# Altium footprint library 电流测试工装板.PcbLib: 36 footprints (part 2 of 3)
Each footprint in its own frame and in the unit in brackets; x right, y up, seen from the top. Pads: shape width x height; smd on the part's side, far side on the other; paste and mask are expansions set on the pad; w line width, h text height; cw(c..) or ccw(c..) is an arc to the next point about the centre after c.
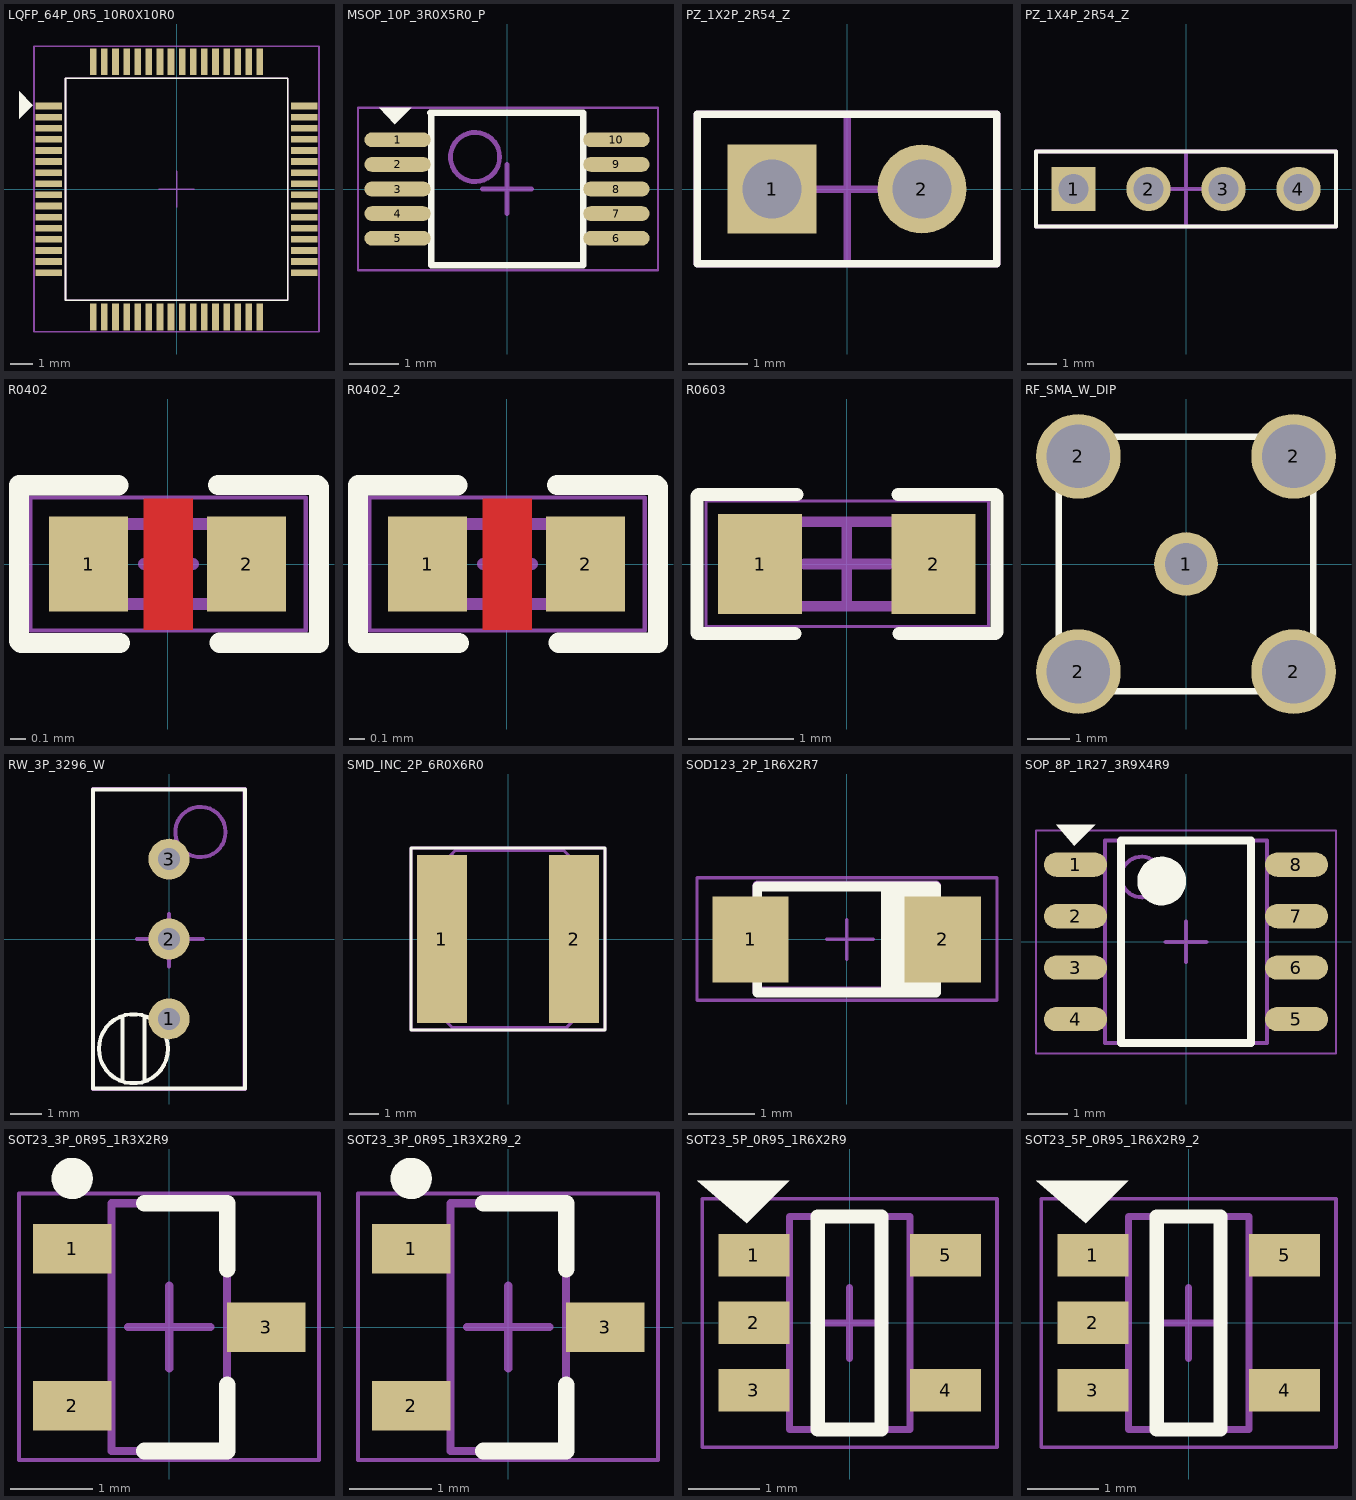
[diagram p1: the footprints below, top view; thin cyan lines are the x and y axes]

## LQFP_64P_0R5_10R0X10R0 [mm]
pads (64):
  rect 1.2x0.3 smd: 1(-5.75,3.75) 2(-5.75,3.25) 3(-5.75,2.75) 4(-5.75,2.25) 5(-5.75,1.75) 6(-5.75,1.25) 7(-5.75,0.75) 8(-5.75,0.25) 9(-5.75,-0.25) 10(-5.75,-0.75) 11(-5.75,-1.25) 12(-5.75,-1.75) 13(-5.75,-2.25) 14(-5.75,-2.75) 15(-5.75,-3.25) 16(-5.75,-3.75) 33(5.75,-3.75) 34(5.75,-3.25) 35(5.75,-2.75) 36(5.75,-2.25) 37(5.75,-1.75) 38(5.75,-1.25) 39(5.75,-0.75) 40(5.75,-0.25) 41(5.75,0.25) 42(5.75,0.75) 43(5.75,1.25) 44(5.75,1.75) 45(5.75,2.25) 46(5.75,2.75) 47(5.75,3.25) 48(5.75,3.75)
  rect 0.3x1.2 smd: 17(-3.75,-5.75) 18(-3.25,-5.75) 19(-2.75,-5.75) 20(-2.25,-5.75) 21(-1.75,-5.75) 22(-1.25,-5.75) 23(-0.75,-5.75) 24(-0.25,-5.75) 25(0.25,-5.75) 26(0.75,-5.75) 27(1.25,-5.75) 28(1.75,-5.75) 29(2.25,-5.75) 30(2.75,-5.75) 31(3.25,-5.75) 32(3.75,-5.75) 49(3.75,5.75) 50(3.25,5.75) 51(2.75,5.75) 52(2.25,5.75) 53(1.75,5.75) 54(1.25,5.75) 55(0.75,5.75) 56(0.25,5.75) 57(-0.25,5.75) 58(-0.75,5.75) 59(-1.25,5.75) 60(-1.75,5.75) 61(-2.25,5.75) 62(-2.75,5.75) 63(-3.25,5.75) 64(-3.75,5.75)
Top Overlay:
  region: -6.485,3.785 -7.095,3.175 -7.095,4.405
  lines w0.075: -5,-5 -5,5 5,5 5,-5 -5,-5
Mechanical 13:
  lines w0.075: -5,-5 5,-5 5,5 -5,5 -5,-5
Mechanical 15:
  lines w0.075: -0.8,0 0.8,0 ; 0,-0.8 0,0.8 ; -6.42,-6.41 6.41,-6.41 6.41,6.44 -6.42,6.44 -6.42,-6.41
3D body "User Library-LQFP64-2.STEP": height 1.62, standoff -0.01, extent -6.072,-6.072 6.072,6.072
3D body: height 0.01, standoff 0, extent -6.42,-6.41 6.41,6.44

## MSOP_10P_3R0X5R0_P [mm]
pads (10):
  oval 1.35x0.3 smd: 1(-2.225,1) 2(-2.225,0.5) 3(-2.225,0) 4(-2.225,-0.5) 5(-2.225,-1) 6(2.225,-1) 7(2.225,-0.5) 8(2.225,0) 9(2.225,0.5) 10(2.225,1)
Top Overlay:
  region: -2.6,1.65 -1.95,1.65 -2.28,1.32
  lines w0.127: -1.56,1.55 -1.54,1.53 -1.54,-1.55 1.55,-1.55 1.55,1.55 -1.56,1.55
Mechanical 13:
  circle w0.1: c-0.65,0.65 r0.5
  lines w0.1: -1.55,-1.55 1.55,-1.55 1.55,1.55 -1.55,1.55 -1.55,-1.55
Mechanical 15:
  lines w0.05: -3.03,-1.65 3.07,-1.65 3.07,1.65 -3.03,1.65 -3.03,-1.65
  lines w0.1: -0.5,0 0.5,0 ; 0,-0.5 0,0.5
3D body "msop10.STEP": height 1.1, standoff 0, extent -2.518,-1.55 2.518,1.55
3D body: height 0.01, standoff 0, extent -3.03,-1.65 3.07,1.65

## PZ_1X2P_2R54_Z [mm]
pads (2):
  rect 1.5x1.5 hole 1: 1(-1.27,0)
  round 1.5 hole 1: 2(1.27,0)
Top Overlay:
  lines w0.127: -2.54,-1.27 0,-1.27 2.54,-1.27 2.54,1.27 0,1.27 -2.54,1.27 -2.54,-1.27
Mechanical 13:
  lines w0.127: -2.54,-1.27 0,-1.27 ; -2.54,-1.27 0,-1.27 ; -2.54,-1.27 -2.54,1.27 0,1.27 2.54,1.27 2.54,-1.27 ; 0,-1.27 2.54,-1.27 ; 0,-1.27 2.54,-1.27
Mechanical 15:
  lines w0.127: -1.27,0 1.27,0 ; 0,-1.27 -2.54,-1.27 -2.54,1.27 0,1.27 ; 0,-1.27 0,1.27 ; 0,-1.27 2.54,-1.27 2.54,1.27 0,1.27 ; 0,-1.27 0,1.27
3D body "排针1P.stp": height 8.57, standoff -2.97, extent -2.54,-1.27 0,1.27
3D body "排针1P.stp": height 8.57, standoff -2.97, extent 0,-1.27 2.54,1.27
3D body: height 0.01, standoff 0, extent -2.54,-1.27 0,1.27
3D body: height 0.01, standoff 0, extent 0,-1.27 2.54,1.27

## PZ_1X4P_2R54_Z [mm]
pads (4):
  rect 1.5x1.5 hole 1: 1(-3.81,0)
  round 1.5 hole 1: 2(-1.27,0) 3(1.27,0) 4(3.81,0)
Top Overlay:
  lines w0.127: -5.08,-1.27 5.08,-1.27 5.08,1.27 -5.08,1.27 -5.08,-1.27
Mechanical 13:
  lines w0.127: -5.08,-1.27 5.08,-1.27 5.08,1.27 -5.08,1.27 -5.08,-1.27
Mechanical 15:
  lines w0.127: -1.27,0 1.27,0 ; 0,-1.27 0,1.27 ; -5.08,-1.27 5.08,-1.27 5.08,1.27 -5.08,1.27 -5.08,-1.27
3D body "排针1P.stp": height 8.57, standoff -2.97, extent 2.54,-1.27 5.08,1.27
3D body "排针1P.stp": height 8.57, standoff -2.97, extent -5.08,-1.27 -2.54,1.27
3D body "排针1P.stp": height 8.57, standoff -2.97, extent -2.54,-1.27 0,1.27
3D body "排针1P.stp": height 8.57, standoff -2.97, extent 0,-1.27 2.54,1.27
3D body: height 0.01, standoff 0, extent -5.08,-1.27 5.08,1.27

## R0402 [mm]
pads (2):
  rect 0.5x0.6 smd: 1(-0.5,0) 2(0.5,0)
Top Layer:
  pour cut-out: -0.15,0.413 -0.15,-0.416 0.16,-0.417 0.16,0.415
Top Overlay:
  lines w0.127: -0.31,0.498 -0.94,0.498 -0.94,-0.488 -0.927,-0.501 -0.3,-0.501 ; 0.318,0.501 0.945,0.501 ; 0.328,-0.498 0.958,-0.498 0.958,0.488
Mechanical 13:
  lines w0.076: -0.508,-0.254 0.508,-0.254 0.508,0.254 -0.508,0.254 -0.508,-0.254
Mechanical 15:
  lines w0.025: -0.866,-0.419 0.874,-0.419 0.874,0.419 -0.866,0.419 -0.866,-0.419
  lines w0.076: -0.15,0 0.16,0 ; 0,-0.21 0,0.2
3D body "r0402.step": height 0.51, standoff 0, extent -0.508,-0.254 0.508,0.254
3D body: height 0.01, standoff 0, extent -0.861,-0.429 0.879,0.409

## R0402_2 [mm]
pads (2):
  rect 0.5x0.6 smd: 1(-0.5,0) 2(0.5,0)
Top Layer:
  pour cut-out: -0.15,0.413 -0.15,-0.416 0.16,-0.417 0.16,0.415
Top Overlay:
  lines w0.127: -0.31,0.498 -0.94,0.498 -0.94,-0.488 -0.927,-0.501 -0.3,-0.501 ; 0.318,0.501 0.945,0.501 ; 0.328,-0.498 0.958,-0.498 0.958,0.488
Mechanical 13:
  lines w0.076: -0.508,-0.254 0.508,-0.254 0.508,0.254 -0.508,0.254 -0.508,-0.254
Mechanical 15:
  lines w0.025: -0.866,-0.419 0.874,-0.419 0.874,0.419 -0.866,0.419 -0.866,-0.419
  lines w0.076: -0.15,0 0.16,0 ; 0,-0.21 0,0.2
3D body "r0402.step": height 0.51, standoff 0, extent -0.508,-0.254 0.508,0.254
3D body: height 0.01, standoff 0, extent -0.861,-0.429 0.879,0.409

## R0603 [mm]
pads (2):
  rect 0.8x0.95 smd: 1(-0.825,0) 2(0.825,0)
Top Overlay:
  lines w0.127: -0.495,-0.66 -1.016,-0.66 -1.42,-0.66 -1.425,-0.655 -1.425,0.645 -1.41,0.66 -1.016,0.66 -0.475,0.66 ; 0.488,0.66 1.016,0.66 1.412,0.66 1.427,0.645 1.427,-0.643 1.41,-0.66 1.016,-0.66 0.495,-0.66
Mechanical 13:
  lines w0.1: -0.8,-0.4 -0.8,0.4 0.8,0.4 0.8,-0.4 -0.8,-0.4
Mechanical 15:
  lines w0.025: -1.339,-0.594 -1.339,0.599 1.346,0.599 1.346,-0.594 -1.339,-0.594
  lines w0.1: -0.4,0 0.4,0 ; 0,-0.4 0,0.4
3D body "r0603.step": height 0.79, standoff 0, extent -1,-0.394 1,0.394
3D body: height 0.01, standoff 0, extent -1.342,-0.599 1.343,0.615

## RF_SMA_W_DIP [mm]
pads (5):
  round 1.5 hole 1: 1(0,0)
  round 2 hole 1.5: 2(-2.54,-2.54) 2(-2.54,2.54) 2(2.54,-2.54) 2(2.54,2.54)
Top Overlay:
  lines w0.15: -3,-3 -3,3 3,3 3,-3 -3,-3
3D body "RF_SMA.step": height 9.86, standoff -3.94, extent -3.5,-3.5 3.5,11.6

## RW_3P_3296_W [mm]
pads (3):
  round 1.3 hole 0.7: 1(0,-2.54) 2(0,0) 3(0,2.54)
Top Overlay:
  circle w0.127: c-1.13,-3.49 r1.1
  lines w0.127: -1.48,-4.51 -1.48,-2.49 ; -0.78,-4.48 -0.78,-2.49 ; -2.41,-4.76 -2.41,4.76 2.41,4.76 2.41,-4.76 -2.41,-4.76
Mechanical 13:
  circle w0.127: c1,3.4 r0.8
  lines w0.127: -2.415,-4.765 -2.415,4.765 2.415,4.765 2.415,-4.765 -2.415,-4.765
Mechanical 15:
  lines w0.127: -1.01,0 1.08,0 ; 0,-0.88 0,0.8 ; -2.42,-4.75 -2.42,4.77 2.38,4.77 2.4,4.75 2.4,-4.75 2.42,-4.77 -2.4,-4.77 -2.42,-4.75
3D body "3296.step": height 11.55, standoff -7.62, extent -2.415,-4.765 2.415,4.765
3D body: height 0.01, standoff 0, extent -2.42,-4.77 2.42,4.77

## SMD_INC_2P_6R0X6R0 [mm]
pads (2):
  rect 1.7x5.7 smd: 1(-2.25,0) 2(2.25,0)
Top Overlay:
  lines w0.1: -3.3,-3.1 3.3,-3.1 3.3,3.1 -3.3,3.1 -3.3,2.8 -3.3,-3.1
Mechanical 13:
  lines w0.1: -1.95,2.85 -1.8,3 1.9,3 ; -1.95,2.85 -1.95,2.85 ; -1.95,2.85 -2.2,2.6 -3,2.6 -3,-2.5 -2.4,-2.5 -1.9,-3 -1.8,-3 2,-3 2.5,-2.5 3,-2.5 3,2.6 2.3,2.6 1.9,3 ; 1.9,3 1.9,3
Mechanical 15:
  lines w0.1: -3.3,-3.1 -3.3,2.8 -3.3,3.1 3.3,3.1 3.3,-3.1 -3.3,-3.1
3D body "6028T150M.step": height 2.81, standoff -0.05, extent -3,-3 3,3
3D body: height 0.01, standoff 0, extent -3.3,-3.1 3.3,3.1

## SOD123_2P_1R6X2R7 [mm]
pads (2):
  rect 1.15x1.3 smd: 1(-1.45,0) 2(1.45,0)
Top Overlay:
  rectangle: 0.52,-0.8 1.35,0.8
  lines w0.15: -1.37,-0.35 -1.76,-0.35 -1.76,0.4 -1.37,0.4 ; 1.43,-0.35 1.82,-0.35 1.82,0.4 1.43,0.4 ; -1.35,-0.8 -1.35,0.8 1.35,0.8 1.35,-0.8 -1.35,-0.8
Mechanical 13:
  rectangle: 0.52,-0.79 1.35,0.81
  lines w0.15: -1.37,-0.34 -1.76,-0.34 -1.76,0.41 -1.37,0.41 ; 1.43,-0.34 1.82,-0.34 1.82,0.41 1.43,0.41 ; -1.35,-0.79 1.35,-0.79 1.35,0.81 -1.35,0.81 -1.35,-0.79
Mechanical 15:
  lines w0.05: -0.3,0 0.4,0 ; 0,-0.3 0,0.3 ; -2.26,-0.92 -2.26,0.93 2.27,0.93 2.27,-0.92 -2.26,-0.92
3D body "SOD123.step": height 1.42, standoff -0.03, extent -1.915,-0.85 1.935,0.85
3D body: height 0.01, standoff 0, extent -2.26,-0.92 2.27,0.93

## SOP_8P_1R27_3R9X4R9 [mm]
pads (8):
  oval 1.55x0.6 smd: 1(-2.725,1.905) 2(-2.725,0.635) 3(-2.725,-0.635) 4(-2.725,-1.905) 5(2.725,-1.905) 6(2.725,-0.635) 7(2.725,0.635) 8(2.725,1.905)
Top Overlay:
  circle w0.6: c-0.6,1.5 r0.3
  region: -3.2,2.89 -2.24,2.89 -2.76,2.37
  lines w0.2: -1.6,-2.5 1.6,-2.5 1.6,2.5 -1.6,2.5 -1.6,-2.5
Mechanical 13:
  circle w0.1: c-1.1,1.6 r0.5
  lines w0.1: -2,-2.5 2,-2.5 2,2.5 -2,2.5 -2,-2.5
Mechanical 15:
  lines w0.05: -3.7,-2.75 3.7,-2.75 3.7,2.75 -3.7,2.75 -3.7,-2.75
  lines w0.1: -0.5,0 0.5,0 ; 0,-0.5 0,0.5
3D body "sop8.step": height 1.75, standoff 0, extent -3.1,-2.5 3.1,2.5
3D body: height 0.01, standoff 0, extent -3.7,-2.75 3.7,2.75

## SOT23_3P_0R95_1R3X2R9 [mm]
pads (3):
  rect 0.95x0.6 smd: 1(-1.175,0.95) 2(-1.175,-0.95) 3(1.175,0)
Top Overlay:
  circle w0.25: c-1.175,1.8 r0.125
  lines w0.2: -0.3,-1.5 0.7,-1.5 0.7,-0.7 ; -0.3,1.5 0.7,1.5 0.7,0.7
Mechanical 13:
  lines w0.1: -0.7,-1.5 0.7,-1.5 0.7,1.5 -0.7,1.5 -0.7,-1.5
Mechanical 15:
  lines w0.05: -1.819,-1.608 1.814,-1.608 1.814,1.618 -1.819,1.618 -1.819,-1.608
  lines w0.1: -0.5,0 0.5,0 ; 0,-0.5 0,0.5
3D body "SOT23-3.step": height 1.3, standoff 0, extent -1.624,-1.487 1.376,1.513
3D body: height 0.01, standoff 0, extent -1.819,-1.608 1.814,1.618

## SOT23_3P_0R95_1R3X2R9_2 [mm]
pads (3):
  rect 0.95x0.6 smd: 1(-1.175,0.95) 2(-1.175,-0.95) 3(1.175,0)
Top Overlay:
  circle w0.25: c-1.175,1.8 r0.125
  lines w0.2: -0.3,-1.5 0.7,-1.5 0.7,-0.7 ; -0.3,1.5 0.7,1.5 0.7,0.7
Mechanical 13:
  lines w0.1: -0.7,-1.5 0.7,-1.5 0.7,1.5 -0.7,1.5 -0.7,-1.5
Mechanical 15:
  lines w0.05: -1.819,-1.608 1.814,-1.608 1.814,1.618 -1.819,1.618 -1.819,-1.608
  lines w0.1: -0.5,0 0.5,0 ; 0,-0.5 0,0.5
3D body "SOT23-3.step": height 1.3, standoff 0, extent -1.624,-1.487 1.376,1.513
3D body: height 0.01, standoff 0, extent -1.819,-1.608 1.814,1.618

## SOT23_5P_0R95_1R6X2R9 [mm]
pads (5):
  rect 1x0.6 smd: 1(-1.35,0.95) 2(-1.35,0) 3(-1.35,-0.95) 4(1.35,-0.95) 5(1.35,0.95)
Top Overlay:
  region: -2.15,2 -0.85,2 -1.45,1.4
  lines w0.2: -0.45,-1.5 -0.45,1.5 0.45,1.5 0.45,-1.5 -0.45,-1.5
Mechanical 13:
  lines w0.1: -0.85,-1.5 0.85,-1.5 0.85,1.5 -0.85,1.5 -0.85,-1.5
Mechanical 15:
  lines w0.05: -2.075,-1.75 2.075,-1.75 2.075,1.75 -2.075,1.75 -2.075,-1.75
  lines w0.1: -0.5,0 0.5,0 ; 0,-0.5 0,0.5
3D body "SOT23_5P_0R95_1R6X2R9.step": height 1.05, standoff -0.05, extent -1.25,-1.5 1.25,1.5

## SOT23_5P_0R95_1R6X2R9_2 [mm]
pads (5):
  rect 1x0.6 smd: 1(-1.35,0.95) 2(-1.35,0) 3(-1.35,-0.95) 4(1.35,-0.95) 5(1.35,0.95)
Top Overlay:
  region: -2.15,2 -0.85,2 -1.45,1.4
  lines w0.2: -0.45,-1.5 -0.45,1.5 0.45,1.5 0.45,-1.5 -0.45,-1.5
Mechanical 13:
  lines w0.1: -0.85,-1.5 0.85,-1.5 0.85,1.5 -0.85,1.5 -0.85,-1.5
Mechanical 15:
  lines w0.05: -2.075,-1.75 2.075,-1.75 2.075,1.75 -2.075,1.75 -2.075,-1.75
  lines w0.1: -0.5,0 0.5,0 ; 0,-0.5 0,0.5
3D body "SOT23_5P_0R95_1R6X2R9.step": height 1.05, standoff -0.05, extent -1.25,-1.5 1.25,1.5